# Altium footprint library ICs And Semiconductors SMD.PcbLib: 602 footprints (part 6 of 38)
Each footprint in its own frame and in the unit in brackets; x right, y up, seen from the top. Pads: shape width x height; smd on the part's side, far side on the other; paste and mask are expansions set on the pad; w line width, h text height; cw(c..) or ccw(c..) is an arc to the next point about the centre after c.
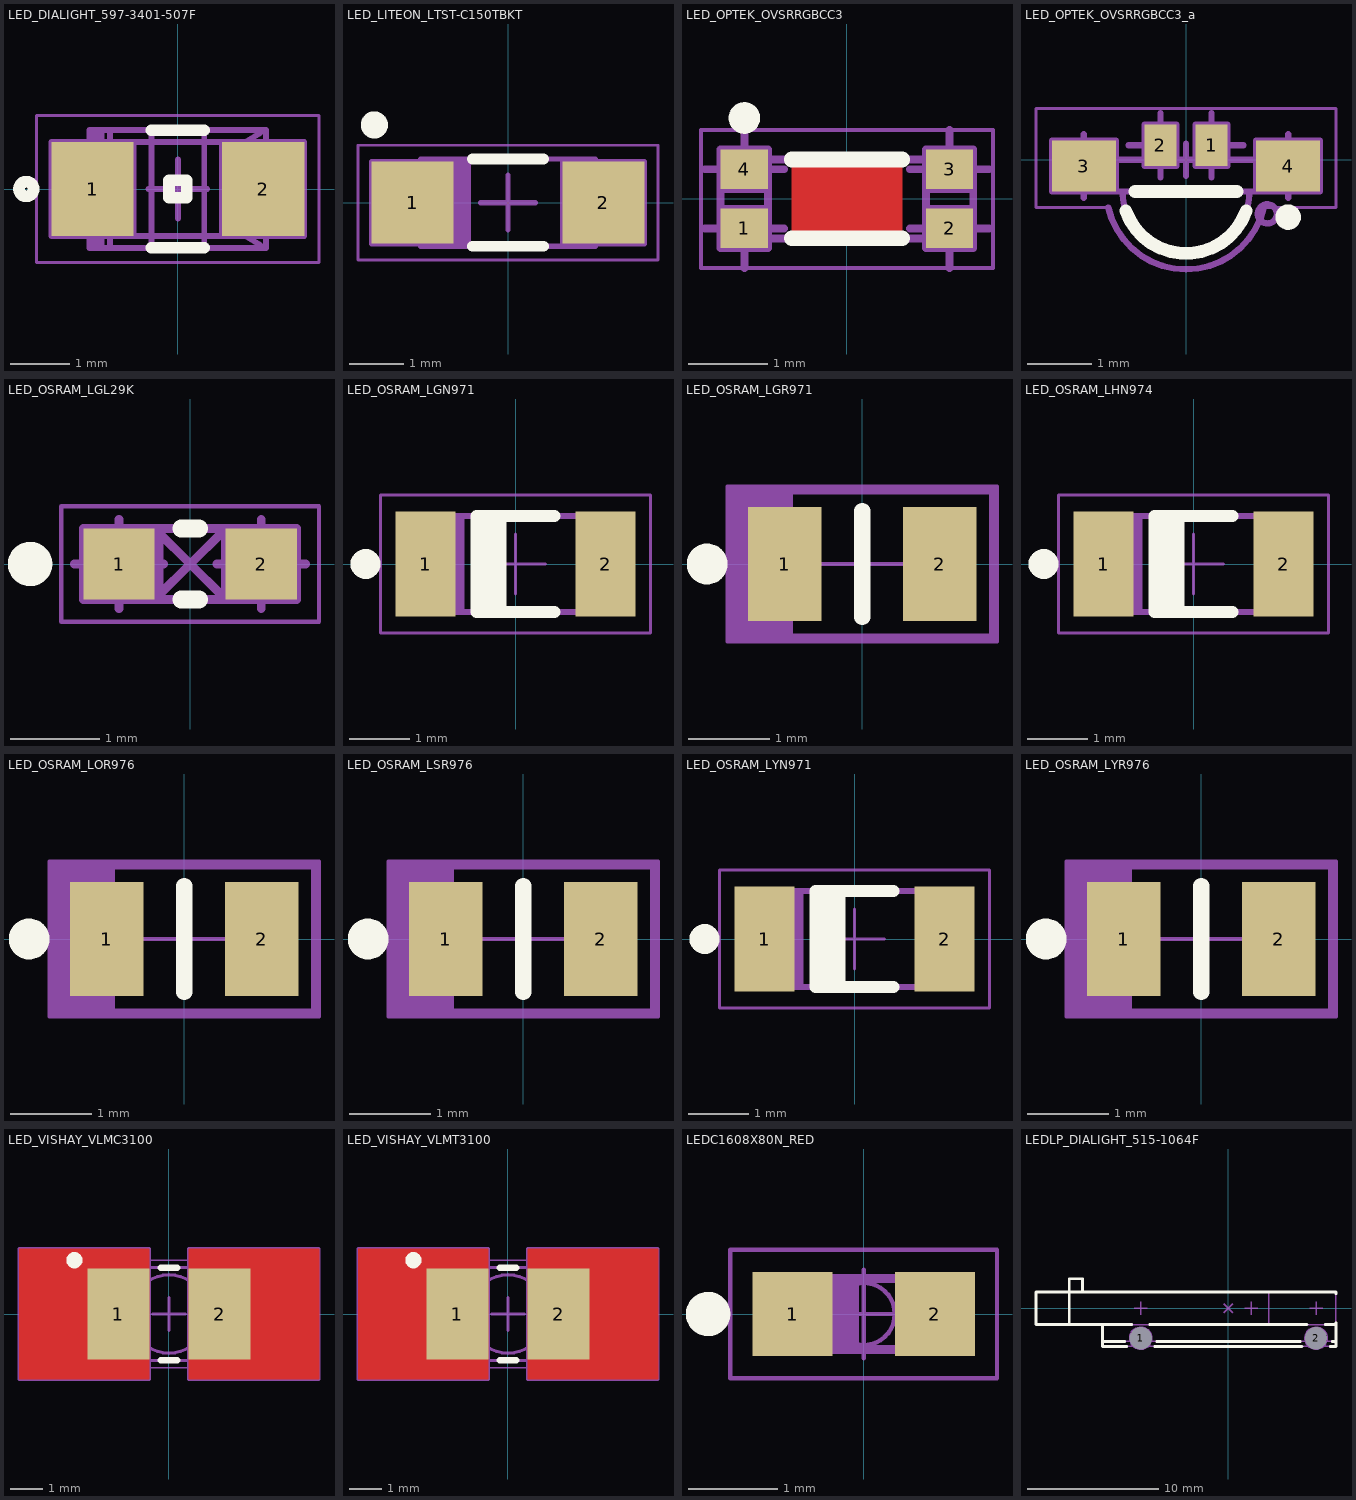
[diagram p5: the footprints below, top view; thin cyan lines are the x and y axes]

## LED_DIALIGHT_597-3401-507F [mm] "SMT Yellow LED, Body 3x1.6mm (1208),  DIALIGHT 597 Serie"
height 1.5
pads (2):
  rect 1.4x1.6 smd: 1(-1.45,0) 2(1.45,0)
Top Overlay:
  circle w0.2: c-2.575,0 r0.125
  lines w0.2: -0.45,-1 0.45,-1 ; -0.45,1 0.45,1 ; -0.15,-0.15 0.15,-0.15 0.15,0.15 -0.15,0.15 -0.15,-0.15
Mechanical 8:
  lines w0.1: -1.95,0 -1.45,0 ; -1.45,-0.5 -1.45,0 ; -1.45,0.5 -1.45,0 ; -0.95,0 -1.45,0 ; -0.5,0 0,0 ; -0.45,-1 -0.45,1 ; 0,-0.5 0,0 ; 0,0.5 0,0 ; 0.45,-1 0.45,1 ; 0.5,0 0,0 ; 0.95,0 1.45,0 ; 1.45,-0.5 1.45,0 ; 1.45,0.5 1.45,0 ; 1.95,0 1.45,0 ; -2.15,-0.8 -0.75,-0.8 -0.75,0.8 -2.15,0.8 -2.15,-0.8 ; 0.75,-0.8 2.15,-0.8 2.15,0.8 0.75,0.8 0.75,-0.8
Mechanical 14:
  lines w0.1: -1.4,-1 -1.4,1 ; -1.3,-1 -1.3,1 ; -1.15,-0.95 -1.15,0.95 ; -1.15,-0.8 1.15,-0.8 ; -1.15,0.8 1.15,0.8 ; 1.4,-0.95 1.15,-0.8 ; 1.4,0.95 1.15,0.8 ; 1.15,-0.8 1.15,0.8 ; -1.5,-1 1.5,-1 1.5,1 -1.5,1 -1.5,-1 ; -0.15,-0.15 0.15,-0.15 0.15,0.15 -0.15,0.15 -0.15,-0.15
Mechanical 15:
  lines w0.05: -2.4,-1.25 2.4,-1.25 2.4,1.25 -2.4,1.25 -2.4,-1.25
3D body "LED_DIALIGHT_597-3401-507F.stp": height 1.5, standoff 0, extent -1.5,-1 1.5,1

## LED_LITEON_LTST-C150TBKT [mm] "SMD InGaN Blue LED, 2-Leads, Body 3.2x1.6mm"
height 1.1
pads (2):
  rect 1.5x1.5 smd: 1(-1.75,0) 2(1.75,0)
Top Overlay:
  circle w0.25: c-2.45,1.425 r0.125
  lines w0.2: -0.65,-0.8 0.65,-0.8 ; -0.65,0.8 0.65,0.8
Mechanical 8:
  lines w0.1: -2.25,0 -1.75,0 ; -1.75,-0.5 -1.75,0 ; -1.75,0.5 -1.75,0 ; -1.25,0 -1.75,0 ; -0.5,0 0,0 ; 0,-0.5 0,0 ; 0,0.5 0,0 ; 0.5,0 0,0 ; 1.25,0 1.75,0 ; 1.75,-0.5 1.75,0 ; 1.75,0.5 1.75,0 ; 2.25,0 1.75,0 ; -2.5,-0.75 -2.5,0.75 -1,0.75 -1,-0.75 -2.5,-0.75 ; 1,-0.75 1,0.75 2.5,0.75 2.5,-0.75 1,-0.75
Mechanical 14:
  lines w0.1: -1.1,-0.8 -1.1,0.8 ; -1.03,-0.8 -1.03,0.8 ; -0.93,-0.8 -0.93,0.8 ; -0.83,-0.8 -0.83,0.8 ; -0.73,-0.8 -0.73,0.8 ; 1.03,-0.8 1.03,0.8 ; -1.6,-0.8 1.6,-0.8 1.6,-0.245 cw(c1.65,0) 1.6,0.245 1.6,0.8 -1.6,0.8 -1.6,0.245 cw(c-1.65,0) -1.6,-0.245 -1.6,-0.8
Mechanical 15:
  lines w0.05: -2.75,-1.05 -2.75,1.05 2.75,1.05 2.75,-1.05 -2.75,-1.05
3D body "LED_LITEON_LTST-C150TBKT.stp": height 1.1, standoff 0, extent -1.6,-0.8 1.6,0.8

## LED_OPTEK_OVSRRGBCC3 [mm] "Top Mount, Full-Color (RGB), 1204 Surface Mount LED (150° Viewing Angle)"
height 1.5
pads (4):
  rect 0.6x0.5 smd: 1(-1.3,-0.375) 2(1.3,-0.375) 3(1.3,0.375) 4(-1.3,0.375)
Top Layer:
  pour cut-out: -0.7,0.5 -0.7,-0.5 0.7,-0.5 0.7,0.5
Top Overlay:
  circle w0.2: c-1.3,1.025 r0.1
  lines w0.2: -0.7,-0.5 0.7,-0.5 ; -0.7,0.5 0.7,0.5
Mechanical 8:
  lines w0.1: -1.8,-0.375 -1.3,-0.375 ; -1.8,0.375 -1.3,0.375 ; -1.3,-0.875 -1.3,-0.375 ; -1.3,0.875 -1.3,0.375 ; -0.8,-0.375 -1.3,-0.375 ; -0.8,0.375 -1.3,0.375 ; -0.5,0 0,0 ; 0,-0.5 0,0 ; 0,0.5 0,0 ; 0.5,0 0,0 ; 0.8,-0.375 1.3,-0.375 ; 0.8,0.375 1.3,0.375 ; 1.3,-0.875 1.3,-0.375 ; 1.3,0.875 1.3,0.375 ; 1.8,-0.375 1.3,-0.375 ; 1.8,0.375 1.3,0.375 ; -1.6,-0.625 -1,-0.625 -1,-0.125 -1.6,-0.125 -1.6,-0.625 ; -1.6,0.125 -1,0.125 -1,0.625 -1.6,0.625 -1.6,0.125 ; 1,-0.625 1.6,-0.625 1.6,-0.125 1,-0.125 1,-0.625 ; 1,0.125 1.6,0.125 1.6,0.625 1,0.625 1,0.125
Mechanical 14:
  lines w0.1: -1.375,0.3 -1.025,0.3 ; -1.3,0.4 -1,0.4 ; -1,-0.5 -1,0.5 ; -1,0.2 -1.6,0.2 ; 1,-0.5 1,0.5 ; 1.299,0.5 ccw(c1.6,0.5) 1.6,0.199 ; 1.3,0.5 -1.3,0.5 cw(c-1.6,0.5) -1.6,0.2 ; 1.6,0.2 1.6,-0.2 ccw(c1.6,-0.5) 1.3,-0.5 -1.3,-0.5 ccw(c-1.6,-0.5) -1.6,-0.2 -1.6,0.2
Mechanical 15:
  lines w0.05: -1.85,-0.875 1.85,-0.875 1.85,0.875 -1.85,0.875 -1.85,-0.875
3D body "LED_OPTEK_OVSRRGBCC3.stp": height 1.47, standoff 0, extent -1.6,-0.5 1.6,0.5

## LED_OPTEK_OVSRRGBCC3_a [mm] "Side Mount, Full-Color (RGB), 1204 Surface Mount LED (150° Viewing Angle)"
height 1
pads (4):
  rect 0.5x0.65 smd: 1(0.4,0.225) 2(-0.4,0.225)
  rect 1x0.8 smd: 3(-1.6,-0.1) 4(1.6,-0.1)
Top Overlay:
  circle w0.2: c1.6,-0.9 r0.1
  lines w0.2: -0.944,-0.8 ccw(c0,-0.47) 0.944,-0.8 ; -0.8,-0.5 0.8,-0.5
Mechanical 8:
  lines w0.1: -2.1,-0.1 -1.6,-0.1 ; -1.6,-0.6 -1.6,-0.1 ; -1.6,0.4 -1.6,-0.1 ; -1.1,-0.1 -1.6,-0.1 ; -0.9,0.225 -0.4,0.225 ; -0.4,-0.275 -0.4,0.225 ; -0.4,0.725 -0.4,0.225 ; -0.25,0 0,0 ; 0,-0.25 0,0 ; 0,0.25 0,0 ; 0.25,0 0,0 ; 0.4,-0.275 0.4,0.225 ; 0.4,0.725 0.4,0.225 ; 0.9,0.225 0.4,0.225 ; 1.1,-0.1 1.6,-0.1 ; 1.6,-0.6 1.6,-0.1 ; 1.6,0.4 1.6,-0.1 ; 2.1,-0.1 1.6,-0.1 ; -2.1,-0.5 -2.1,0.3 -1.1,0.3 -1.1,-0.5 -2.1,-0.5 ; -0.65,-0.1 -0.65,0.55 -0.15,0.55 -0.15,-0.1 -0.65,-0.1 ; 0.15,-0.1 0.15,0.55 0.65,0.55 0.65,-0.1 0.15,-0.1 ; 1.1,-0.5 1.1,0.3 2.1,0.3 2.1,-0.5 1.1,-0.5
Mechanical 14:
  circle w0.1: c1.275,-0.85 r0.15
  lines w0.1: -1,-0.5 ccw(c0,-0.47) 1,-0.5 ; -1.6,-0.5 1.6,-0.5 1.6,0 -1.6,0 -1.6,-0.5
Mechanical 15:
  lines w0.05: -1.218,-0.75 -2.35,-0.75 -2.35,0.8 2.35,0.8 2.35,-0.75 1.218,-0.75
  lines w0.1: -1.218,-0.75 ccw(c0,-0.47) 1.218,-0.75
3D body "LED_OPTEK_OVSRRGBCC3_a.stp": height 1, standoff 0, extent -1.6,-1.37 1.6,0.105

## LED_OSRAM_LGL29K [mm] "Green Chip LED, 2-Leads, Body 1.7x0.8mm, IPC Medium Density"
height 0.67
pads (2):
  rect 0.8x0.8 smd: 1(-0.8,0) 2(0.8,0)
Top Overlay:
  circle w0.25: c-1.8,0 r0.125
  lines w0.2: -0.1,-0.4 0.1,-0.4 ; -0.1,0.4 0.1,0.4
Mechanical 8:
  lines w0.1: -1.3,0 -0.8,0 ; -0.8,-0.5 -0.8,0 ; -0.8,0.5 -0.8,0 ; -0.354,-0.354 0,0 ; -0.354,0.354 0,0 ; -0.3,0 -0.8,0 ; 0.3,0 0.8,0 ; 0.354,-0.354 0,0 ; 0.354,0.354 0,0 ; 0.8,-0.5 0.8,0 ; 0.8,0.5 0.8,0 ; 1.3,0 0.8,0 ; -1.2,-0.4 -0.4,-0.4 -0.4,0.4 -1.2,0.4 -1.2,-0.4 ; 0.4,-0.4 1.2,-0.4 1.2,0.4 0.4,0.4 0.4,-0.4
Mechanical 14:
  lines w0.1: -0.65,-0.35 -0.85,-0.35 -0.85,0.35 -0.65,0.35 ; -0.55,-0.4 -0.55,0.4 ; -0.45,-0.4 -0.45,0.4 ; -0.35,-0.4 -0.35,0.4 ; 0.65,-0.35 0.85,-0.35 0.85,0.35 0.65,0.35 ; -0.65,-0.4 -0.65,0.4 0.65,0.4 0.65,-0.4 -0.65,-0.4
Mechanical 15:
  lines w0.05: -1.45,-0.65 -1.45,0.65 1.45,0.65 1.45,-0.65 -1.45,-0.65
3D body "LED_OSRAM_LGL29K.stp": height 0.67, standoff 0, extent -0.85,-0.4 0.85,0.4

## LED_OSRAM_LGN971 [mm] "Green Chip LED, 2-Leads, Body 3.2 x1.6mm, IPC Medium Density"
height 1.2
pads (2):
  rect 1x1.75 smd: 1(-1.5,0) 2(1.5,0)
Top Overlay:
  circle w0.25: c-2.5,0 r0.125
  lines w0.2: -0.45,-0.8 -0.45,0.8 ; -0.25,-0.8 -0.25,0.8 ; 0.65,-0.8 -0.65,-0.8 -0.65,0.8 0.65,0.8
Mechanical 14:
  lines w0.1: -1.5,-0.8 -1.5,0.8 ; -1.4,-0.8 -1.4,0.8 ; -1.3,-0.8 -1.3,0.8 ; -1.2,-0.8 -1.2,0.8 ; -1.1,-0.8 -1.1,0.8 ; -1,-0.8 -1,0.8 ; -0.9,-0.8 -0.9,0.8 ; -1.6,-0.8 -1.6,0.8 1.6,0.8 1.6,-0.8 -1.6,-0.8
Mechanical 15:
  lines w0.05: -0.5,0 0.5,0 ; 0,-0.5 0,0.5 ; -2.25,-1.15 -2.25,1.15 2.25,1.15 2.25,-1.15 -2.25,-1.15
3D body "LED_OSRAM_LGN971.stp": height 1.2, standoff 0, extent -1.65,-0.85 1.65,0.85

## LED_OSRAM_LGR971 [mm] "Green Chip LED, 2-Leads, Body 2.0x1.25mm, IPC Medium Density"
height 0.9
pads (2):
  rect 0.9x1.4 smd: 1(-0.95,0) 2(0.95,0)
Top Overlay:
  circle w0.25: c-1.9,0 r0.125
  lines w0.2: 0,-0.65 0,0.65
Mechanical 14:
  lines w0.1: -1.5,-0.9 -1.5,0.9 ; -1.4,-0.9 -1.4,0.9 ; -1.3,-0.9 -1.3,0.9 ; -1.2,-0.9 -1.2,0.9 ; -1.1,-0.9 -1.1,0.9 ; -1,-0.9 -1,0.9 ; -0.9,-0.9 -0.9,0.9 ; -1.6,-0.9 1.6,-0.9 1.6,0.9 -1.6,0.9 -1.6,-0.9
Mechanical 15:
  lines w0.05: -0.5,0 0.5,0 ; 0,-0.5 0,0.5 ; -1.65,-0.95 1.65,-0.95 1.65,0.95 -1.65,0.95 -1.65,-0.95
3D body "LED_OSRAM_LGR971.stp": height 0.9, standoff 0, extent -1.05,-0.675 1.05,0.675

## LED_OSRAM_LHN974 [mm] "Red Chip LED, 2-Leads, Body 3.2 x1.6mm, IPC Medium Density"
height 1.2
pads (2):
  rect 1x1.75 smd: 1(-1.5,0) 2(1.5,0)
Top Overlay:
  circle w0.25: c-2.5,0 r0.125
  lines w0.2: -0.45,-0.8 -0.45,0.8 ; -0.25,-0.8 -0.25,0.8 ; 0.65,-0.8 -0.65,-0.8 -0.65,0.8 0.65,0.8
Mechanical 14:
  lines w0.1: -1.5,-0.8 -1.5,0.8 ; -1.4,-0.8 -1.4,0.8 ; -1.3,-0.8 -1.3,0.8 ; -1.2,-0.8 -1.2,0.8 ; -1.1,-0.8 -1.1,0.8 ; -1,-0.8 -1,0.8 ; -0.9,-0.8 -0.9,0.8 ; -1.6,-0.8 -1.6,0.8 1.6,0.8 1.6,-0.8 -1.6,-0.8
Mechanical 15:
  lines w0.05: -0.5,0 0.5,0 ; 0,-0.5 0,0.5 ; -2.25,-1.15 -2.25,1.15 2.25,1.15 2.25,-1.15 -2.25,-1.15
3D body "LED_OSRAM_LHN974.stp": height 1.2, standoff 0, extent -1.65,-0.85 1.65,0.85

## LED_OSRAM_LOR976 [mm] "Orange Chip LED, 2-Leads, Body 2.0x1.25mm, IPC Medium Density"
height 0.9
pads (2):
  rect 0.9x1.4 smd: 1(-0.95,0) 2(0.95,0)
Top Overlay:
  circle w0.25: c-1.9,0 r0.125
  lines w0.2: 0,-0.65 0,0.65
Mechanical 14:
  lines w0.1: -1.5,-0.9 -1.5,0.9 ; -1.4,-0.9 -1.4,0.9 ; -1.3,-0.9 -1.3,0.9 ; -1.2,-0.9 -1.2,0.9 ; -1.1,-0.9 -1.1,0.9 ; -1,-0.9 -1,0.9 ; -0.9,-0.9 -0.9,0.9 ; -1.6,-0.9 1.6,-0.9 1.6,0.9 -1.6,0.9 -1.6,-0.9
Mechanical 15:
  lines w0.05: -0.5,0 0.5,0 ; 0,-0.5 0,0.5 ; -1.65,-0.95 1.65,-0.95 1.65,0.95 -1.65,0.95 -1.65,-0.95
3D body "LED_OSRAM_LOR976.stp": height 0.9, standoff 0, extent -1.05,-0.675 1.05,0.675

## LED_OSRAM_LSR976 [mm] "Super Red Chip LED, 2-Leads, Body 2.0x1.25mm, IPC Medium Density"
height 0.9
pads (2):
  rect 0.9x1.4 smd: 1(-0.95,0) 2(0.95,0)
Top Overlay:
  circle w0.25: c-1.9,0 r0.125
  lines w0.2: 0,-0.65 0,0.65
Mechanical 14:
  lines w0.1: -1.5,-0.9 -1.5,0.9 ; -1.4,-0.9 -1.4,0.9 ; -1.3,-0.9 -1.3,0.9 ; -1.2,-0.9 -1.2,0.9 ; -1.1,-0.9 -1.1,0.9 ; -1,-0.9 -1,0.9 ; -0.9,-0.9 -0.9,0.9 ; -1.6,-0.9 1.6,-0.9 1.6,0.9 -1.6,0.9 -1.6,-0.9
Mechanical 15:
  lines w0.05: -0.5,0 0.5,0 ; 0,-0.5 0,0.5 ; -1.65,-0.95 1.65,-0.95 1.65,0.95 -1.65,0.95 -1.65,-0.95
3D body "LED_OSRAM_LSR976.stp": height 0.9, standoff 0, extent -1.05,-0.675 1.05,0.675

## LED_OSRAM_LYN971 [mm] "Yellow Chip LED, 2-Leads, Body 3.2 x1.6mm, IPC Medium Density"
height 1.2
pads (2):
  rect 1x1.75 smd: 1(-1.5,0) 2(1.5,0)
Top Overlay:
  circle w0.25: c-2.5,0 r0.125
  lines w0.2: -0.45,-0.8 -0.45,0.8 ; -0.25,-0.8 -0.25,0.8 ; 0.65,-0.8 -0.65,-0.8 -0.65,0.8 0.65,0.8
Mechanical 14:
  lines w0.1: -1.5,-0.8 -1.5,0.8 ; -1.4,-0.8 -1.4,0.8 ; -1.3,-0.8 -1.3,0.8 ; -1.2,-0.8 -1.2,0.8 ; -1.1,-0.8 -1.1,0.8 ; -1,-0.8 -1,0.8 ; -0.9,-0.8 -0.9,0.8 ; -1.6,-0.8 -1.6,0.8 1.6,0.8 1.6,-0.8 -1.6,-0.8
Mechanical 15:
  lines w0.05: -0.5,0 0.5,0 ; 0,-0.5 0,0.5 ; -2.25,-1.15 -2.25,1.15 2.25,1.15 2.25,-1.15 -2.25,-1.15
3D body "LED_OSRAM_LYN971.stp": height 1.2, standoff 0, extent -1.65,-0.85 1.65,0.85

## LED_OSRAM_LYR976 [mm] "Yellow Chip LED, 2-Leads, Body 2.0x1.25mm, IPC Medium Density"
height 0.9
pads (2):
  rect 0.9x1.4 smd: 1(-0.95,0) 2(0.95,0)
Top Overlay:
  circle w0.25: c-1.9,0 r0.125
  lines w0.2: 0,-0.65 0,0.65
Mechanical 14:
  lines w0.1: -1.5,-0.9 -1.5,0.9 ; -1.4,-0.9 -1.4,0.9 ; -1.3,-0.9 -1.3,0.9 ; -1.2,-0.9 -1.2,0.9 ; -1.1,-0.9 -1.1,0.9 ; -1,-0.9 -1,0.9 ; -0.9,-0.9 -0.9,0.9 ; -1.6,-0.9 1.6,-0.9 1.6,0.9 -1.6,0.9 -1.6,-0.9
Mechanical 15:
  lines w0.05: -0.5,0 0.5,0 ; 0,-0.5 0,0.5 ; -1.65,-0.95 1.65,-0.95 1.65,0.95 -1.65,0.95 -1.65,-0.95
3D body "LED_OSRAM_LYR976.stp": height 0.9, standoff 0, extent -1.05,-0.675 1.05,0.675

## LED_VISHAY_VLMC3100 [mm] "Molded SMD Green LED, 2-Leads, Body 3.5x2.8mm, VLMC3100 Series"
height 1.85
pads (2):
  rect 1.9x2.8 smd: 1(-1.55,0) 2(1.55,0)
Top Layer:
  region: -4.6,2 -4.6,-2 -0.6,-2 -0.6,2
  region: 0.6,2 0.6,-2 4.6,-2 4.6,2
Top Overlay:
  circle w0.25: c-2.9,1.65 r0.125
  lines w0.2: -0.25,-1.425 0.25,-1.425 ; -0.25,1.425 0.25,1.425
Mechanical 8:
  lines w0.1: -2.05,0 -1.55,0 ; -1.55,-0.5 -1.55,0 ; -1.55,0.5 -1.55,0 ; -1.05,0 -1.55,0 ; -0.5,0 0,0 ; 0,-0.5 0,0 ; 0,0.5 0,0 ; 0.5,0 0,0 ; 1.05,0 1.55,0 ; 1.55,-0.5 1.55,0 ; 1.55,0.5 1.55,0 ; 2.05,0 1.55,0 ; -4.6,-2 -0.6,-2 -0.6,2 -4.6,2 -4.6,-2 ; -2.5,-1.4 -0.6,-1.4 -0.6,1.4 -2.5,1.4 -2.5,-1.4 ; 0.6,-2 4.6,-2 4.6,2 0.6,2 0.6,-2 ; 0.6,-1.4 2.5,-1.4 2.5,1.4 0.6,1.4 0.6,-1.4
Mechanical 14:
  circle w0.1: c0,0 r1.2
  lines w0.1: -1.85,1.1 -1.85,-1.1 -1.575,-1.1 ; -1.849,1.1 -1.575,1.1 ; -1.575,0.618 -0.768,1.425 ; -1.575,0.759 -0.909,1.425 ; -1.575,0.901 -1.051,1.425 ; -1.575,1.042 -1.192,1.425 ; -1.575,1.184 -1.334,1.425 ; -1.575,1.325 -1.475,1.425 ; 1.575,-1.1 1.85,-1.1 1.85,1.1 1.575,1.1 ; -1.575,-1.425 -1.575,1.425 ; -1.575,-1.425 1.575,-1.425 1.575,1.425 -1.575,1.425 ; -1.575,-1.425 -1.575,1.425
Mechanical 15:
  lines w0.05: -2.75,-1.65 2.75,-1.65 2.75,1.65 -2.75,1.65 -2.75,-1.65
3D body "LED_VISHAY_VLMC3100.stp": height 1.75, standoff 0, extent -1.85,-1.425 1.85,1.425

## LED_VISHAY_VLMT3100 [mm] "Molded SMD Red LED, 2-Leads, Body 3.5x2.8mm, VLMT3100 Series"
height 1.85
pads (2):
  rect 1.9x2.8 smd: 1(-1.55,0) 2(1.55,0)
Top Layer:
  region: -4.6,2 -4.6,-2 -0.6,-2 -0.6,2
  region: 0.6,2 0.6,-2 4.6,-2 4.6,2
Top Overlay:
  circle w0.25: c-2.9,1.65 r0.125
  lines w0.2: -0.25,-1.425 0.25,-1.425 ; -0.25,1.425 0.25,1.425
Mechanical 8:
  lines w0.1: -2.05,0 -1.55,0 ; -1.55,-0.5 -1.55,0 ; -1.55,0.5 -1.55,0 ; -1.05,0 -1.55,0 ; -0.5,0 0,0 ; 0,-0.5 0,0 ; 0,0.5 0,0 ; 0.5,0 0,0 ; 1.05,0 1.55,0 ; 1.55,-0.5 1.55,0 ; 1.55,0.5 1.55,0 ; 2.05,0 1.55,0 ; -4.6,-2 -0.6,-2 -0.6,2 -4.6,2 -4.6,-2 ; -2.5,-1.4 -0.6,-1.4 -0.6,1.4 -2.5,1.4 -2.5,-1.4 ; 0.6,-2 4.6,-2 4.6,2 0.6,2 0.6,-2 ; 0.6,-1.4 2.5,-1.4 2.5,1.4 0.6,1.4 0.6,-1.4
Mechanical 14:
  circle w0.1: c0,0 r1.2
  lines w0.1: -1.85,1.1 -1.85,-1.1 -1.575,-1.1 ; -1.849,1.1 -1.575,1.1 ; -1.575,0.618 -0.768,1.425 ; -1.575,0.759 -0.909,1.425 ; -1.575,0.901 -1.051,1.425 ; -1.575,1.042 -1.192,1.425 ; -1.575,1.184 -1.334,1.425 ; -1.575,1.325 -1.475,1.425 ; 1.575,-1.1 1.85,-1.1 1.85,1.1 1.575,1.1 ; -1.575,-1.425 -1.575,1.425 ; -1.575,-1.425 1.575,-1.425 1.575,1.425 -1.575,1.425 ; -1.575,-1.425 -1.575,1.425
Mechanical 15:
  lines w0.05: -2.75,-1.65 2.75,-1.65 2.75,1.65 -2.75,1.65 -2.75,-1.65
3D body "LED_VISHAY_VLMT3100.stp": height 1.75, standoff 0, extent -1.85,-1.425 1.85,1.425

## LEDC1608X80N_RED [mm] "Chip RED LED, 2-Leads, Body 1.6x0.8mm, IPC Medium Density"
height 0.8
pads (2):
  rect 0.9x0.95 smd: 1(-0.8,0) 2(0.8,0)
Top Overlay:
  circle w0.25: c-1.75,0 r0.125
Mechanical 14:
  lines w0.1: -0.7,-0.4 -0.7,0.4 ; -0.6,-0.4 -0.6,0.4 ; -0.5,-0.4 -0.5,0.4 ; -0.4,-0.4 -0.4,0.4 ; -0.3,-0.4 -0.3,0.4 ; -0.2,-0.4 -0.2,0.4 ; -0.1,-0.4 -0.1,0.4 ; -0.8,-0.4 0.8,-0.4 0.8,0.4 -0.8,0.4 -0.8,-0.4
Mechanical 15:
  circle w0.05: c0,0 r0.35
  lines w0.05: -0.5,0 0.5,0 ; 0,-0.5 0,0.5 ; -1.5,-0.725 1.5,-0.725 1.5,0.725 -1.5,0.725 -1.5,-0.725
3D body "LEDC1608X80N_RED.stp": height 0.8, standoff 0, extent -0.8,-0.4 0.8,0.4

## LEDLP_DIALIGHT_515-1064F [mm] "Right Angle Tri-Level 2.5mm Round Light Pipe, Body 22.9 x5.22mm"
height 13.7
pads (2):
  round 1 hole 1.7 unplated mask+0.35: 1(-6.704,-2.29) 2(6.706,-2.29)
Top Overlay:
  lines w0.2: -12.167,-1.249 -12.167,2.257 -11.151,2.257 -11.151,1.241 ; -9.627,-2.544 -7.928,-2.544 ; -7.781,-2.925 -9.627,-2.925 -9.627,-1.249 ; -7.396,-1.249 -9.627,-1.249 ; -6.013,-1.249 6.014,-1.249 ; -5.628,-2.925 5.629,-2.925 ; -5.48,-2.544 5.482,-2.544 ; 7.397,-1.249 8.23,-1.249 ; 7.782,-2.925 8.23,-2.925 8.23,-1.1 ; 7.93,-2.544 8.23,-2.544 ; 8.23,1.1 8.23,1.241 -14.707,1.241 -14.707,-1.249 -9.627,-1.249
Mechanical 8:
  circle w0.1: c6.706,-2.29 r0.85
  circle w0.1: c-6.704,-2.29 r0.85
  lines w0.1: -7.204,-2.29 -6.704,-2.29 ; -7.204,0 -6.704,0 ; -6.704,-2.79 -6.704,-2.29 ; -6.704,-1.79 -6.704,-2.29 ; -6.704,-0.5 -6.704,0 ; -6.704,0.5 -6.704,0 ; -6.204,-2.29 -6.704,-2.29 ; -6.204,0 -6.704,0 ; -0.354,-0.354 0,0 ; -0.354,0.354 0,0 ; 0.354,-0.354 0,0 ; 0.354,0.354 0,0 ; 1.256,0 1.756,0 ; 1.756,-0.5 1.756,0 ; 1.756,0.5 1.756,0 ; 2.256,0 1.756,0 ; 6.206,-2.29 6.706,-2.29 ; 6.206,0 6.706,0 ; 6.706,-2.79 6.706,-2.29 ; 6.706,-1.79 6.706,-2.29 ; 6.706,-0.5 6.706,0 ; 6.706,0.5 6.706,0 ; 7.206,-2.29 6.706,-2.29 ; 7.206,0 6.706,0
Mechanical 14:
  lines w0.1: -12.167,-1.249 -12.167,2.257 -11.151,2.257 -11.151,1.241 ; -9.627,-2.544 8.23,-2.544 ; 3.078,-1.249 3.078,1.241 ; 8.23,-1.249 -9.627,-1.249 ; -9.627,-1.249 -14.707,-1.249 -14.707,1.241 8.23,1.241 8.23,-2.925 -9.627,-2.925 -9.627,-1.249
3D body "LEDLP_DIALIGHT_515-1064F.stp": height 13.69, standoff -2.87, extent -14.706,-2.925 8.23,2.257